# Altium footprint library Chestin_PcbLib.PcbLib: 203 footprints (part 2 of 13)
Each footprint in its own frame and in the unit in brackets; x right, y up, seen from the top. Pads: shape width x height; smd on the part's side, far side on the other; paste and mask are expansions set on the pad; w line width, h text height; cw(c..) or ccw(c..) is an arc to the next point about the centre after c.
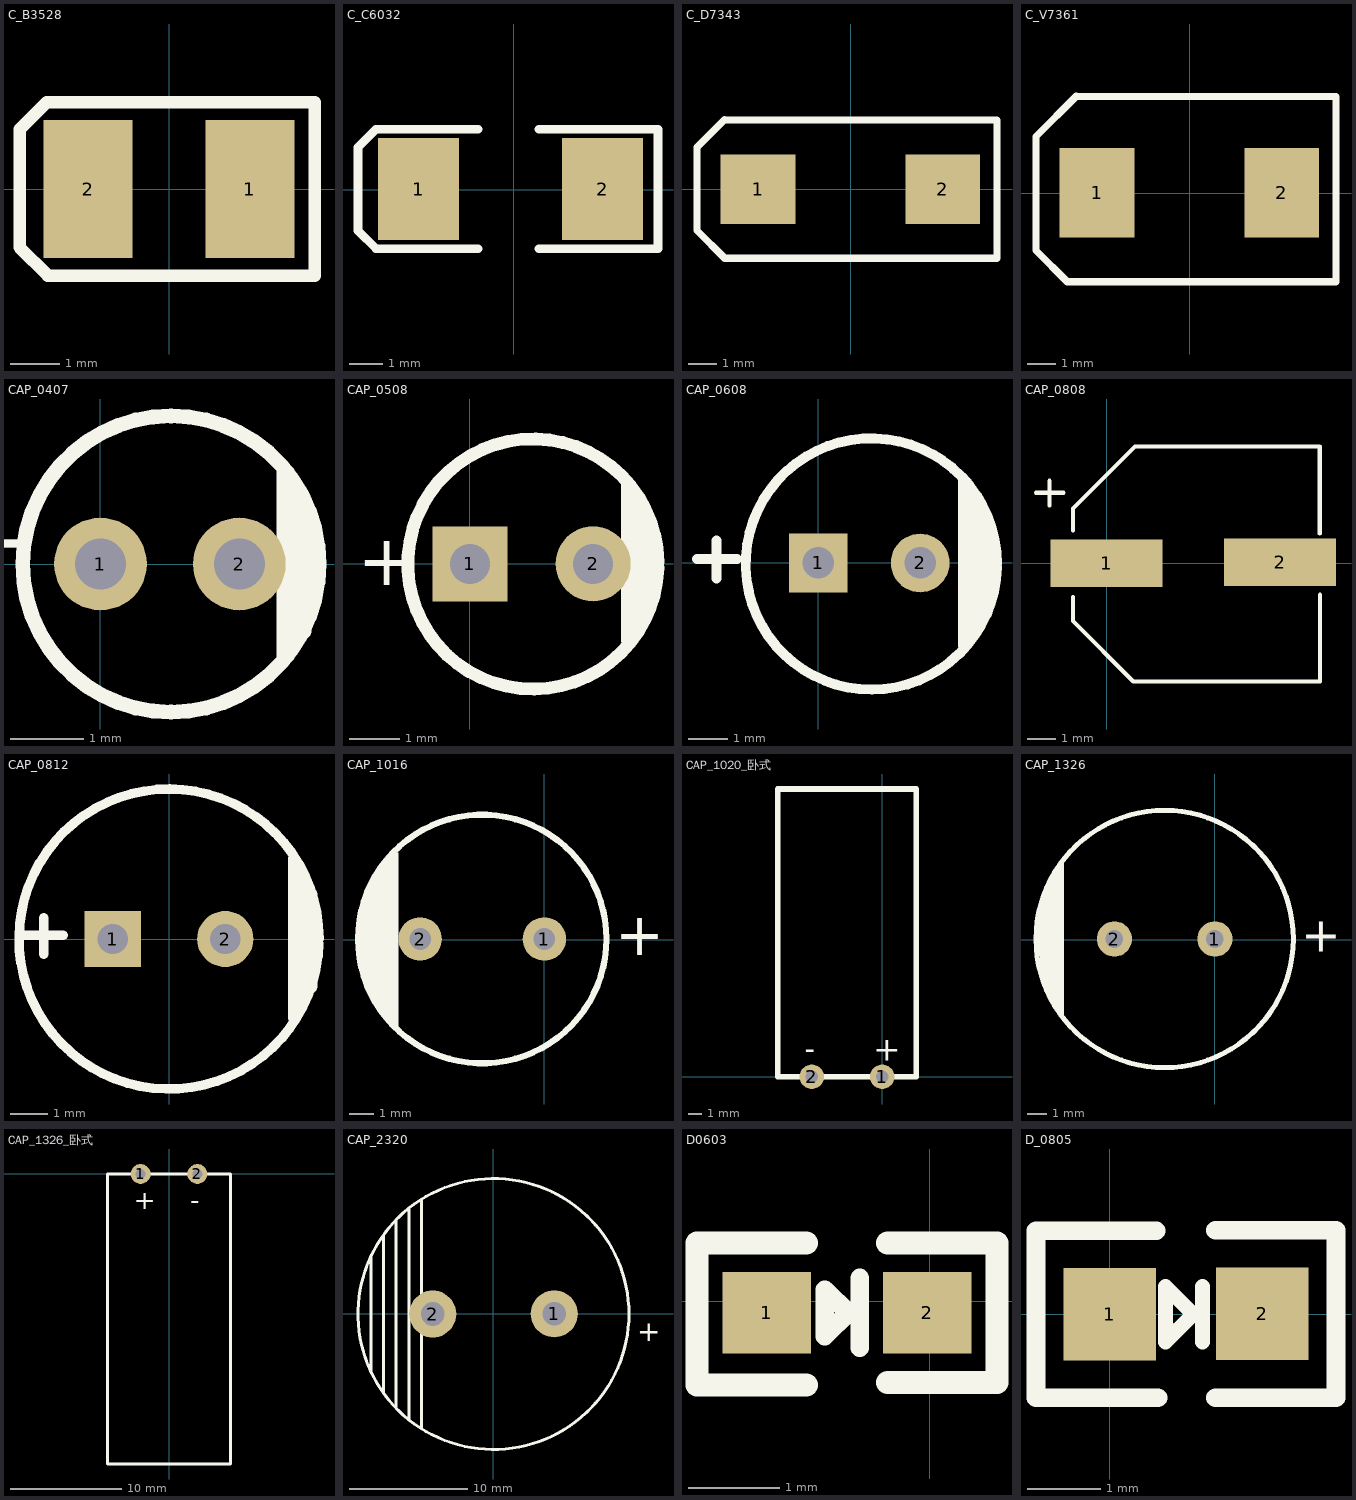
[diagram p1: the footprints below, top view; thin cyan lines are the x and y axes]

## C_B3528 [mil] "B型"
pads (2):
  rect 70.87x110 smd: 1(64.5,0) 2(-64.5,0)
Top Overlay:
  lines w10: -119,-46.5 -119,47.5 -97.5,69 116,69 116,-69 -96.5,-69 -119,-46.5
3D body "TAJ-B.STEP": height 74.8, standoff 0, extent -68.9,-55.11 68.9,55.12

## C_C6032 [mil]
pads (2):
  rect 95x120 smd: 1(-112,1) 2(104,1)
Top Overlay:
  lines w10: -42,-69 -156,-69 -162,-69 -183,-48 -183,50 -163,70 -162,71 -42,71 ; 29,-69 169,-69 169,71 29,71
3D body "TAJ-C.STEP": height 102.36, standoff 0, extent -121.11,-61.99 115.11,63.99

## C_D7343 [mm] "D型"
pads (2):
  rect 2.6x2.4 smd: 1(-3.202,0.007) 2(3.198,0.007)
Top Overlay:
  lines w0.254: -4.369,-2.388 5.08,-2.388 5.08,2.388 ; -4.362,-2.388 -5.325,-1.425 -5.325,1.457 -4.369,2.413 5.08,2.406
3D body: height 0.3, standoff 0, extent -3.487,-0.869 -3.392,0.82
3D body: height 0.3, standoff 0, extent 3.308,-0.855 3.512,0.915
3D body "TAJ-D.STEP": height 2.9, standoff 0, extent -3.65,-2.124 3.65,2.176

## C_V7361 [mm] "D型"
pads (2):
  rect 2.6x3.1 smd: 1(-3.202,0.007) 2(3.198,0.007)
Top Overlay:
  lines w0.254: -5.325,-1.99 -4.242,-3.073 5.08,-3.073 5.08,3.352 -3.931,3.359 -5.325,1.965 -5.325,-1.99
3D body "capcp7361x38.step": height 3.45, standoff 0, extent -3.75,-3.048 3.75,3.252

## CAP_0407 [mm]
pads (2):
  round 1.27 hole 0.7: 1(0,0) 2(1.905,0)
Top Overlay:
  circle w0.203: c0.965,0 r2.032
  lines w0.254: 2.54,-1.245 2.54,1.245 ; 2.769,-0.914 2.769,0.864
  text "+" at -1.118,-0.305 h1.02
3D body "Cap 4x7.STEP": height 7.01, standoff -16.99, extent -1.028,-1.981 2.972,2.019

## CAP_0508 [mm]
pads (2):
  rect 1.5x1.5 hole 0.8: 1(0,0)
  round 1.5 hole 0.8: 2(2.462,0)
Top Overlay:
  lines w0.254: 3.758,-0.076 cw(c1.259,-0.004) 3.758,0.037
  lines w0.3: 3.173,-1.524 3.173,1.549
  lines w0.5: 3.427,-0.94 3.427,0.94
  text "+" at -2.237,-0.432 h1.02
3D body "C5x8.STEP": height 8.13, standoff -2.37, extent -1.268,-2.503 3.732,2.489

## CAP_0608 [mm]
pads (2):
  rect 1.5x1.5 hole 0.8: 1(0,0)
  round 1.5 hole 0.8: 2(2.6,0)
Top Overlay:
  lines w0.254: -3.1,0.1 -2.084,0.1 ; -2.6,-0.4 -2.6,0.567 ; 3.688,-2.108 3.688,2.159 ; 4.561,-0.116 cw(c1.352,-0.028) 4.562,-0.025
  lines w0.3: 3.942,-1.88 3.942,1.778
  lines w0.5: 4.196,-1.245 4.196,1.168
3D body "6_3x7x2_5mm.STEP": height 7.53, standoff -3.01, extent -1.85,-3.201 4.501,3.15

## CAP_0808 [mm]
pads (2):
  rect 4x1.7 smd: 1(0,0) 2(6.202,0.042)
Top Overlay:
  lines w0.15: -2.524,2.529 -1.54,2.529 ; -2.043,2.069 -2.043,2.958 ; -1.207,-1.196 -1.207,-2.064 0.952,-4.223 7.631,-4.223 7.631,-1.122 ; -1.196,1.18 -1.196,1.968 1.016,4.18 7.62,4.18 7.62,1.069
3D body "SL-H.STEP": height 10.5, standoff 0, extent -1.399,-4.154 7.601,4.146

## CAP_0812 [mm]
pads (2):
  rect 1.5x1.5 hole 0.8: 1(-1.5,0)
  round 1.5 hole 0.8: 2(1.5,0)
Top Overlay:
  lines w0.254: -3.838,0.1 -2.822,0.1 ; -3.338,-0.4 -3.338,0.567 ; 3.302,-2.108 3.302,2.159 ; 3.998,-0.11 cw(c0,0) 4,0.003
  lines w0.3: 3.458,-1.753 3.458,1.905
  lines w0.5: 3.712,-1.245 3.712,1.168
3D body "2.STEP": height 12, standoff -2, extent -4,-4 3.98,4

## CAP_1016 [mil] "RB.2/.4"
pads (2):
  round 70 hole 35: 1(0,1) 2(-200,1)
Top Overlay:
  circle w10: c-100,1 r200
  rectangle: -295,-60 -265,55
  rectangle: -285,-80 -260,90
  rectangle: -270,-110 -245,115
  rectangle: -250,-140 -235,140
  lines w11.81: -245,130 ccw(c-105.35,2.7) -241.45,-128.39
  text "+" at 114,-25 h68.9
3D body "Cap 10x16.STEP": height 708.66, standoff -669.29, extent -296.85,-197.7 96.85,196

## CAP_1020_卧式 [mil] "RB.2/.4"
pads (2):
  round 70 hole 35: 1(0,0) 2(-200,0)
Top Overlay:
  lines w15.75: -296.85,0 96.85,0 96.85,818.9 -296.85,818.9 -296.85,0
  text "+" at -25,45 h68.9
  text "-" at -220,50 h60

## CAP_1326 [mil] "RB.2/.5"
pads (2):
  round 70 hole 35: 1(0,1) 2(-200,1)
Top Overlay:
  circle w10: c-100,1 r255.91
  rectangle: -312,-149 -300,152
  rectangle: -323,-132 -309,135
  rectangle: -332,-114 -314,121
  lines w10: -349,-29 -349,45 ; -343,-68 -343,72 ; -336,-97 -336,96
  text "+" at 172,-24 h68.9
3D body "Cap 12.5x20.STEP": height 786.92, standoff -748.03, extent -348.12,-245.12 144,247

## CAP_1326_卧式 [mil] "RB.2/.5"
pads (2):
  round 70 hole 35: 1(-100,0) 2(100,0)
Top Overlay:
  lines w10: -216.54,-1023.62 216.54,-1023.62 216.54,0 -216.54,0 -216.54,-1023.62
  text "-" at 75,-125 h68.9
  text "+" at -125,-125 h68.9

## CAP_2320 [mm] "RB.2/.5"
pads (2):
  round 4 hole 2: 1(5.156,0) 2(-5.156,-0.013)
Top Overlay:
  circle w0.254: c0,-0.013 r11.5
  lines w0.254: -10.389,-4.928 -10.389,4.928 ; -9.322,-6.756 -9.322,6.706 ; -8.255,-7.95 -8.255,8.001 ; -7.188,-8.992 -7.188,8.865 ; -6.096,-9.754 -6.096,9.728
  text "+" at 12.217,-2.311 h1.75
3D body "C22X25.step": height 25, standoff 0, extent -10.899,-11.026 11.101,10.975

## D0603 [mil]
pads (2):
  rect 38x35 smd: 1(-70,-5) 2(-1,-5)
Top Overlay:
  lines w8: -30,-20 -30,10 ; -45,-15 -45,5 -35,-5 -45,-15
  lines w10: -53,-36 -100,-36 -100,25 -53,25 ; -18,-35 29,-35 29,25 -18,25
3D body: height 17.72, standoff 0, extent -66.49,-20.74 -3.5,10.75

## D_0805 [mm] "2012"
pads (2):
  rect 1.27x1.27 smd: 1(0,0) 2(2.09,0.005)
Top Overlay:
  lines w0.203: 1.27,-0.381 1.27,0.381 ; 0.762,-0.381 1.143,0 0.762,0.381 0.762,-0.381
  lines w0.254: 0.635,1.143 -1.011,1.143 -1.011,-1.143 0.66,-1.143 ; 1.448,-1.143 3.099,-1.143 3.099,1.148 1.448,1.148
3D body: height 0.55, standoff 0, extent 0.036,-0.62 2.036,0.64